# Altium footprint library zynq.PcbLib: 111 footprints (part 6 of 7)
Each footprint in its own frame and in the unit in brackets; x right, y up, seen from the top. Pads: shape width x height; smd on the part's side, far side on the other; paste and mask are expansions set on the pad; w line width, h text height; cw(c..) or ccw(c..) is an arc to the next point about the centre after c.
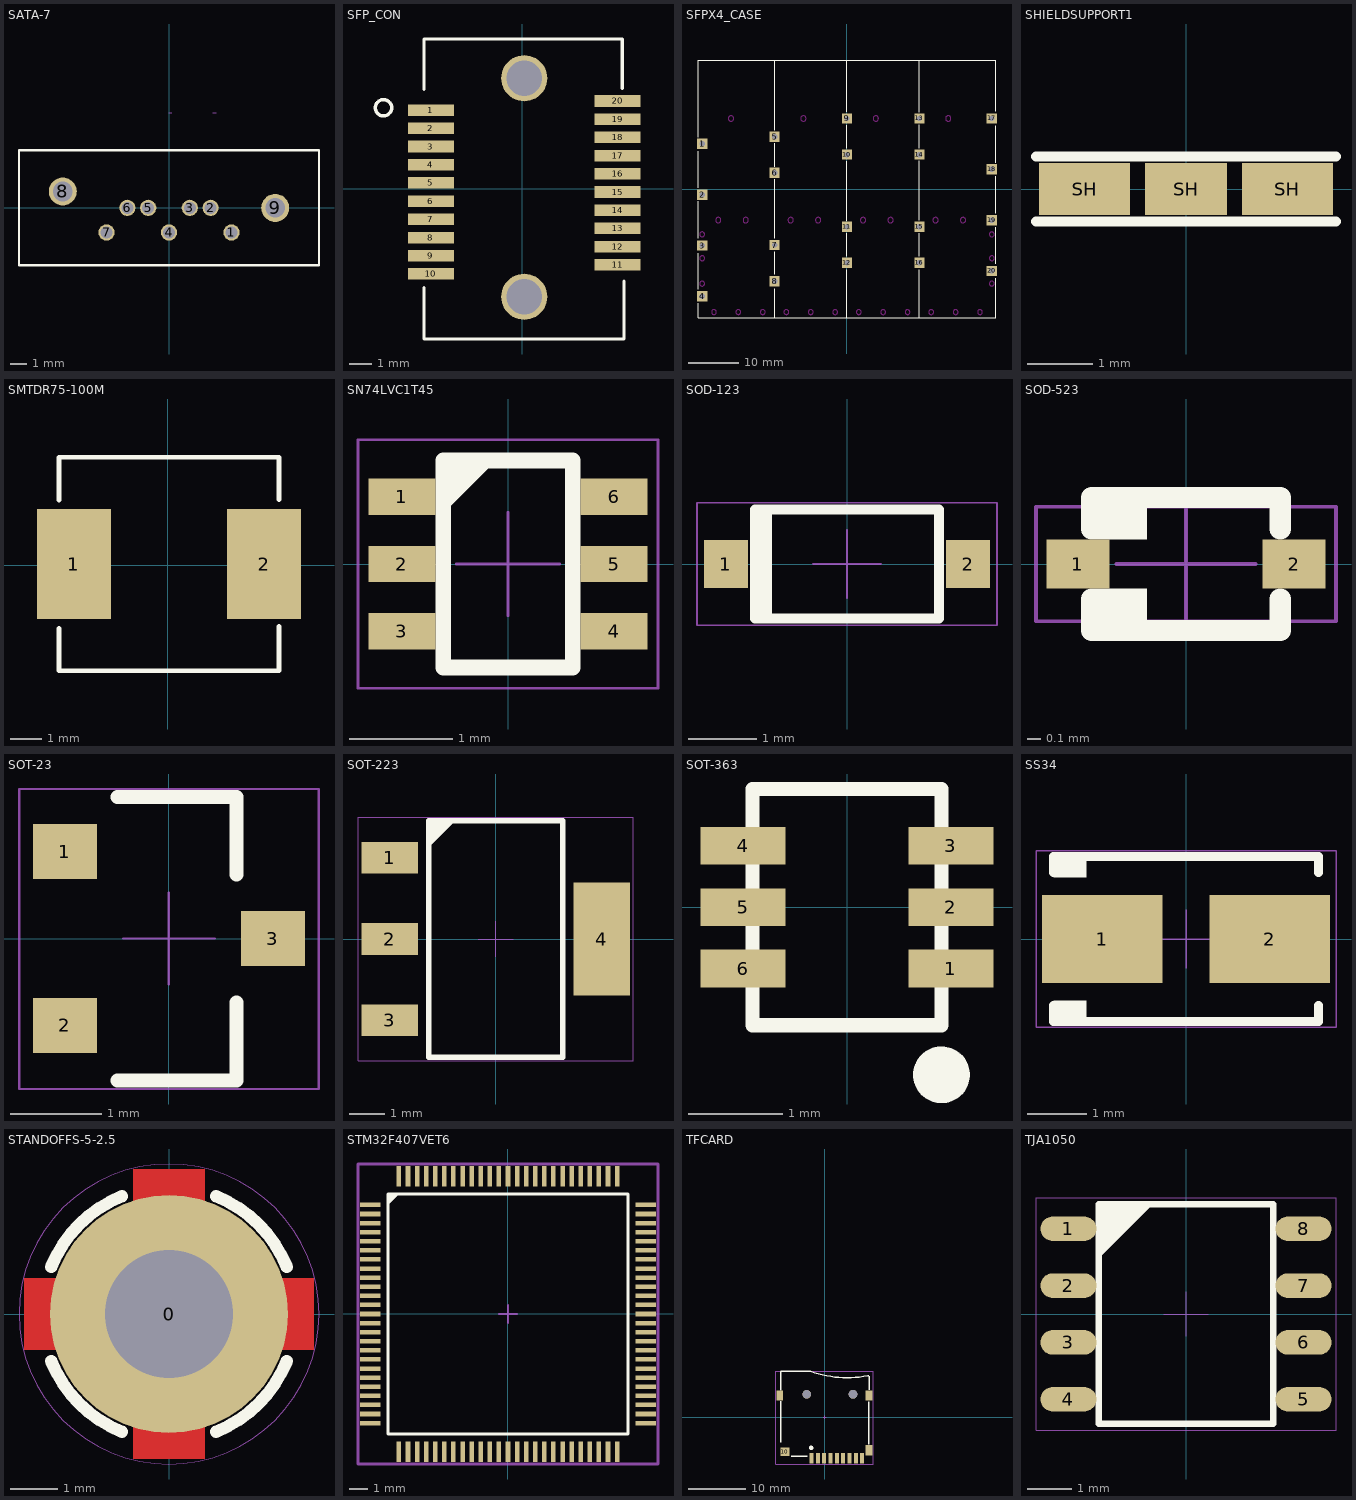
[diagram p5: the footprints below, top view; thin cyan lines are the x and y axes]

## SATA-7 [mm] "SATA-7"
pads (9):
  round 0.994 hole 0.74: 1(3.81,-1.5) 2(2.54,0) 3(1.27,0) 4(0,-1.5) 5(-1.27,0) 6(-2.54,0) 7(-3.81,-1.5)
  round 1.708 hole 1.2: 8(-6.48,1) 9(6.48,0)
Top Overlay:
  lines w0.152: -9.15,-3.5 -9.15,3.5 9.15,3.5 9.15,-3.5 -9.15,-3.5
Mechanical 11:
  lines w0.025: -0.025,5.802 0.178,5.802 ; 2.667,5.802 2.87,5.802

## SFP_CON [mil] "SFP_CON"
pads (22):
  rect 80x20 smd: 1(-158,136) 2(-158,104.5) 3(-158,73.01) 4(-158,41.51) 5(-158,10.02) 6(-158,-21.48) 7(-158,-52.98) 8(-158,-84.47) 9(-158,-115.97) 10(-158,-147.46) 11(164.83,-131.72) 12(164.83,-100.22) 13(164.83,-68.72) 14(164.83,-37.23) 15(164.83,-5.73) 16(164.83,25.76) 17(164.83,57.26) 18(164.83,88.76) 19(164.83,120.25) 20(164.83,151.75)
  round 80 hole 62: " "(3.42,-186.83) " "(3.42,191.12)
Top Overlay:
  circle w6: c-240,140 r14.14
  lines w6: -170,-171 -170,-260 176,-260 176,-160 ; -170,172 -170,259 173,259 173,174

## SFPX4_CASE [mil] "SFPX4_CASE"
pads (20):
  rect 80x80 hole 42: 1(-1122.04,349.41) 2(-1122.04,-44.29) 3(-1122.04,-437.99) 4(-1122.04,-831.69) 5(-561.02,404.53) 6(-561.02,125) 7(-561.02,-434.05) 8(-561.02,-713.58) 9(0,546.26) 10(0,266.74) 11(0,-292.32) 12(0,-571.85) 13(561.02,546.26) 14(561.02,266.74) 15(561.02,-292.32) 16(561.02,-571.85) 17(1122.04,546.26) 18(1122.04,152.56) 19(1122.04,-241.14) 20(1122.04,-634.84)
Top Overlay:
  lines w6: -1153.54,-885.98 -1153.54,-999.01 1153.54,-999.01 1153.54,-690.98 ; -1153.54,-775.98 -1153.54,-495.98 ; -1153.54,-380.98 -1153.54,-95.98 ; -1153.54,9.02 -1153.54,294.02 ; -1153.54,399.02 -1153.54,999.02 1153.54,999.02 1153.54,604.02 ; -561.02,-995.98 -561.02,-770.98 ; -561.02,-660.98 -561.02,-485.98 ; -561.02,-380.98 -561.02,74.02 ; -561.02,174.02 -561.02,354.02 ; -561.02,454.02 -561.02,998 -560,999.02 ; 0,-995.98 0,-625.98 ; 0,-520.98 0,-340.98 ; 0,-245.98 0,214.02 ; 0,314.02 0,494.02 ; 0,599.02 0,998 1.02,999.02 ; 561.02,-995.98 561.02,-625.98 ; 561.02,-520.98 561.02,-340.98 ; 561.02,-240.98 561.02,219.02 ; 561.02,314.02 561.02,499.02 ; 561.02,594.02 561.02,998 562.04,999.02 ; 1153.54,-580.98 1153.54,-295.98 ; 1153.54,-185.98 1153.54,99.02 ; 1153.54,204.02 1153.54,489.02
Keep-Out Layer:
  circle w1: c-337.79,546.26 r21
  circle w1: c-223.62,-241.14 r21
  circle w1: c-436.22,-241.14 r21
  circle w1: c223.23,546.26 r21
  circle w1: c337.4,-241.14 r21
  circle w1: c124.8,-241.14 r21
  circle w1: c-280.71,-953.74 r19
  circle w1: c-469.68,-953.74 r19
  circle w1: c-91.73,-953.74 r19
  circle w1: c280.31,-953.74 r19
  circle w1: c91.34,-953.74 r19
  circle w1: c469.29,-953.74 r19
  circle w1: c-997.24,-241.14 r21
  circle w1: c-784.64,-241.14 r21
  circle w1: c-1122.04,-351.38 r19
  circle w1: c-1122.04,-536.42 r19
  circle w1: c-1122.04,-733.27 r19
  circle w1: c-841.73,-953.74 r19
  circle w1: c-1030.7,-953.74 r19
  circle w1: c-652.75,-953.74 r19
  circle w1: c-898.81,546.26 r21
  circle w1: c784.25,546.26 r21
  circle w1: c685.82,-241.14 r21
  circle w1: c898.42,-241.14 r21
  circle w1: c1122.04,-351.38 r19
  circle w1: c1122.04,-536.42 r19
  circle w1: c1122.04,-733.27 r19
  circle w1: c652.36,-953.74 r19
  circle w1: c841.33,-953.74 r19
  circle w1: c1030.31,-953.74 r19
Mechanical 10:
  text "1" at -1122.04,359.41 h25
  text "2" at -1122.04,-34.29 h25
  text "3" at -1122.04,-427.99 h25
  text "4" at -1122.04,-821.69 h25
  text "5" at -561.02,414.53 h25
  text "6" at -561.02,135 h25
  text "7" at -561.02,-424.05 h25
  text "8" at -561.02,-703.58 h25
  text "9" at 0,556.26 h25
  text "10" at 0,286.74 h25
  text "11" at 0,-272.32 h25
  text "12" at 0,-551.85 h25
  text "13" at 561.02,566.26 h25
  text "14" at 561.02,286.74 h25
  text "15" at 561.02,-272.32 h25
  text "16" at 561.02,-551.85 h25
  text "17" at 1122.04,566.26 h25
  text "18" at 1122.04,172.56 h25
  text "19" at 1122.04,-221.14 h25
  text "20" at 1122.04,-614.84 h25

## SHIELDSUPPORT1 [mm] "YS0073A1 L4.4xW0.8xH0.8 0.2"
pads (3):
  rect 1.4x0.8 smd: SH(-1.555,0) SH(1.555,0)
  rect 1.25x0.8 smd: SH(0,0)
Top Overlay:
  lines w0.152: -2.3,-0.5 2.3,-0.5 ; -2.3,0.5 2.3,0.5

## SMTDR75-100M [mil] "SMTDR75-100M"
pads (2):
  rect 92.5x137.8 smd: 1(-117.59,1.5) 2(120.59,1.5)
Top Overlay:
  lines w6: -136.3,-79.5 -136.3,-132.36 139.3,-132.36 139.3,-76.5 ; -136.3,81.5 -136.3,135.36 139.3,135.36 139.3,82.5

## SN74LVC1T45 [mm]
height 1
pads (6):
  rect 0.65x0.35 smd: 1(-1.025,0.65) 2(-1.025,0) 3(-1.025,-0.65) 4(1.025,-0.65) 5(1.025,0) 6(1.025,0.65)
Top Overlay:
  region: -0.127,0.991 -0.625,0.492 -0.625,1
  lines w0.152: -0.625,-1 0.625,-1 0.625,1 -0.625,1 -0.625,-1
Mechanical 15:
  lines w0.025: -0.5,0 0.5,0 ; 0,-0.5 0,0.5 ; -1.45,-1.2 1.45,-1.2 1.45,1.2 -1.45,1.2 -1.45,-1.2
3D body "sn74lvc1t45dckr.STEP": height 0.98, standoff 0, extent -1.035,-1 1.035,1

## SOD-123 [mm]
pads (2):
  rect 0.65x0.7 smd: 1(-1.775,0) 2(1.775,0)
Top Overlay:
  rectangle: -1.35,-0.8 -1.1,0.8
  lines w0.152: -1.35,-0.8 -1.35,0.8 1.35,0.8 1.35,-0.8 -1.35,-0.8
Mechanical 15:
  lines w0.025: -0.5,0 0.5,0 ; 0,-0.5 0,0.5 ; -2.2,-0.9 2.2,-0.9 2.2,0.9 -2.2,0.9 -2.2,-0.9
3D body "sod123.STEP": height 1.17, standoff 0, extent -1.85,-0.8 1.85,0.8

## SOD-523 [mm]
pads (2):
  rect 0.45x0.35 smd: 1(-0.775,0) 2(0.775,0)
Top Overlay:
  rectangle: -0.676,0.174 -0.281,0.476
  rectangle: -0.676,-0.476 -0.281,-0.174
  lines w0.152: -0.676,-0.25 -0.676,-0.476 0.676,-0.476 0.676,-0.25 ; -0.676,0.25 -0.676,0.476 0.676,0.476 0.676,0.25
Mechanical 15:
  lines w0.025: -0.5,0 0.5,0 ; 0,-0.5 0,0.5 ; -1.075,-0.41 -1.075,0.41 1.075,0.41 1.075,-0.41 -1.075,-0.41
3D body "sod523.STEP": height 0.65, standoff 0, extent -0.774,-0.402 0.773,0.398

## SOT-23 [mm] "SOT-23"
pads (3):
  rect 0.7x0.6 smd: 1(-1.137,0.95) 2(-1.137,-0.95) 3(1.138,0)
Top Overlay:
  lines w0.152: -0.562,-1.55 0.738,-1.55 0.738,-0.7 ; -0.562,1.55 0.738,1.55 0.738,0.7
Mechanical 15:
  lines w0.025: -0.5,0 0.5,0 ; 0,-0.5 0,0.5 ; -1.637,-1.645 -1.637,1.635 1.64,1.635 1.64,-1.645 -1.637,-1.645
3D body "sot23-3.STEP": height 1.04, standoff 0, extent -1.244,-1.499 1.221,1.501

## SOT-223 [mm] "SOT223, 4-Leads, Body 6.50x7.00mm (avg), Pitch 2.30mm, IPC High Density"
height 1.8
pads (4):
  rect 1.6x0.9 smd: 1(-3,2.3) 2(-3,0) 3(-3,-2.3)
  rect 1.6x3.2 smd: 4(3,0)
Top Overlay:
  region: -1.9,3.35 -1.15,3.35 -1.9,2.6
  lines w0.152: -1.9,-3.35 1.9,-3.35 1.9,3.35 -1.9,3.35 -1.9,-3.35
Mechanical 15:
  lines w0.025: -0.5,0 0.5,0 ; 0,-0.5 0,0.5 ; -3.9,-3.45 3.9,-3.45 3.9,3.45 -3.9,3.45 -3.9,-3.45
3D body "sot223.STEP": height 1.68, standoff 0.01, extent -3.408,-3.244 3.431,3.256

## SOT-363 [mm]
pads (6):
  rect 0.9x0.4 smd: 1(1.1,-0.65) 2(1.1,0) 3(1.1,0.65) 4(-1.1,0.65) 5(-1.1,0) 6(-1.1,-0.65)
Top Overlay:
  circle w0.3: c1,-1.773 r0.15
  lines w0.152: -1,-1.25 1,-1.25 1,1.25 -1,1.25 -1,-1.25

## SS34 [mm] "Molded Diode, 2-Leads, Body 4.25x2.67mm, IPC High Density"
height 2.42
pads (2):
  rect 2.05x1.5 smd: 1(-1.425,0) 2(1.425,0)
Top Overlay:
  rectangle: -2.25,-1.4 -1.691,-1.049
  rectangle: -2.25,1.049 -1.691,1.4
  lines w0.152: -2.25,-1.126 -2.25,-1.4 2.25,-1.4 2.25,-1.126 ; -2.25,1.126 -2.25,1.4 2.25,1.4 2.25,1.126
Mechanical 15:
  lines w0.025: -0.5,0 0.5,0 ; 0,-0.5 0,0.5 ; -2.55,-1.5 2.55,-1.5 2.55,1.5 -2.55,1.5 -2.55,-1.5
3D body "do-214ac.STEP": height 2.06, standoff 0.01, extent -2.351,-1.324 2.351,1.346

## STANDOFFS-5-2.5 [mm] "外径5 台阶外径2.5"
pads (1):
  round 5 / inner round 5 / far side round 0 hole 2.7: 0(0,0)
Top Layer:
  region: 0.762,-1.422 -0.762,-1.422 -0.762,-3.048 0.762,-3.048
  region: 1.422,0.762 1.422,-0.762 3.048,-0.762 3.048,0.762
  rectangle: -0.762,1.422 0.762,3.048
  region: -1.422,-0.762 -1.422,0.762 -3.048,0.762 -3.048,-0.762
Top Overlay:
  lines w0.254: -2.476,-0.99 ccw(c0,0) -0.99,-2.476 ; -2.476,0.99 cw(c0,0) -0.99,2.476 ; 0.99,-2.476 ccw(c0,0) 2.476,-0.99 ; 0.99,2.476 cw(c0,0) 2.476,0.99
Top Paste:
  region: 1.191,2.114 0.818,1.445 1.48,0.783 2.15,1.155
  region: 2.337,0.653 1.6,0.443 1.6,-0.493 2.337,-0.704
  region: 2.337,0.653 1.6,0.443 1.6,-0.493 2.337,-0.704
  region: 2.114,-1.191 1.445,-0.818 0.783,-1.48 1.155,-2.15
  region: 0.653,-2.337 0.443,-1.6 -0.493,-1.6 -0.704,-2.337
  region: -1.191,-2.114 -0.818,-1.445 -1.48,-0.783 -2.15,-1.155
  region: -2.337,-0.653 -1.6,-0.443 -1.6,0.493 -2.337,0.704
  region: -2.114,1.191 -1.445,0.818 -0.783,1.48 -1.155,2.15
  region: -0.653,2.337 -0.443,1.6 0.493,1.6 0.704,2.337
Top Solder:
  region: 0.762,-1.422 -0.762,-1.422 -0.762,-3.048 0.762,-3.048
  region: 1.422,0.762 1.422,-0.762 3.048,-0.762 3.048,0.762
  rectangle: -0.762,1.422 0.762,3.048
  region: -1.422,-0.762 -1.422,0.762 -3.048,0.762 -3.048,-0.762
Mechanical 15:
  circle w0.025: c0,0 r3.155
  lines w0.025: -0.381,0 0.381,0 ; 0,-0.381 0,0.381
3D body "cp-m2-3.2-5.SLDPRT": height 3.2, standoff -1.5, extent -2.497,-2.5 2.497,2.5

## STM32F407VET6 [mm]
pads (100):
  rect 1.15x0.25 smd: 1(-7.575,6) 2(-7.575,5.5) 3(-7.575,5) 4(-7.575,4.5) 5(-7.575,4) 6(-7.575,3.5) 7(-7.575,3) 8(-7.575,2.5) 9(-7.575,2) 10(-7.575,1.5) 11(-7.575,1) 12(-7.575,0.5) 13(-7.575,0) 14(-7.575,-0.5) 15(-7.575,-1) 16(-7.575,-1.5) 17(-7.575,-2) 18(-7.575,-2.5) 19(-7.575,-3) 20(-7.575,-3.5) 21(-7.575,-4) 22(-7.575,-4.5) 23(-7.575,-5) 24(-7.575,-5.5) 25(-7.575,-6) 51(7.575,-6) 52(7.575,-5.5) 53(7.575,-5) 54(7.575,-4.5) 55(7.575,-4) 56(7.575,-3.5) 57(7.575,-3) 58(7.575,-2.5) 59(7.575,-2) 60(7.575,-1.5) 61(7.575,-1) 62(7.575,-0.5) 63(7.575,0) 64(7.575,0.5) 65(7.575,1) 66(7.575,1.5) 67(7.575,2) 68(7.575,2.5) 69(7.575,3) 70(7.575,3.5) 71(7.575,4) 72(7.575,4.5) 73(7.575,5) 74(7.575,5.5) 75(7.575,6)
  rect 0.25x1.15 smd: 26(-6,-7.575) 27(-5.5,-7.575) 28(-5,-7.575) 29(-4.5,-7.575) 30(-4,-7.575) 31(-3.5,-7.575) 32(-3,-7.575) 33(-2.5,-7.575) 34(-2,-7.575) 35(-1.5,-7.575) 36(-1,-7.575) 37(-0.5,-7.575) 38(0,-7.575) 39(0.5,-7.575) 40(1,-7.575) 41(1.5,-7.575) 42(2,-7.575) 43(2.5,-7.575) 44(3,-7.575) 45(3.5,-7.575) 46(4,-7.575) 47(4.5,-7.575) 48(5,-7.575) 49(5.5,-7.575) 50(6,-7.575) 76(6,7.575) 77(5.5,7.575) 78(5,7.575) 79(4.5,7.575) 80(4,7.575) 81(3.5,7.575) 82(3,7.575) 83(2.5,7.575) 84(2,7.575) 85(1.5,7.575) 86(1,7.575) 87(0.5,7.575) 88(0,7.575) 89(-0.5,7.575) 90(-1,7.575) 91(-1.5,7.575) 92(-2,7.575) 93(-2.5,7.575) 94(-3,7.575) 95(-3.5,7.575) 96(-4,7.575) 97(-4.5,7.575) 98(-5,7.575) 99(-5.5,7.575) 100(-6,7.575)
Top Overlay:
  region: -5.969,6.604 -6.604,5.969 -6.604,6.596 -6.6,6.6
  lines w0.152: -6.6,-6.6 6.6,-6.6 6.6,6.6 -6.6,6.6 -6.6,-6.6
Mechanical 15:
  lines w0.1: -0.5,0 0.5,0 ; 0,-0.5 0,0.5
  lines w0.152: -8.25,-8.25 8.25,-8.25 8.25,8.25 -8.25,8.25 -8.25,-8.25

## TFCARD [mil]
pads (15):
  rect 27.56x70.87 smd: 1(-92,-280.5) 2(-48.69,-280.5) 3(-5.39,-280.5) 4(37.92,-280.5) 5(81.23,-280.5) 6(124.54,-280.5) 7(167.84,-280.5) 8(211.15,-280.5) 9(254.46,-280.5)
  rect 62.99x59.06 smd: 10(-273.1,-235.22)
  rect 47.24x70.87 smd: 11(301.7,-225.38) 12(301.7,148.63) 13(-308.54,148.63)
  round 59.06 hole 59.06 unplated: ""(-124,156.51) ""(192,156.51)
Top Overlay:
  circle w29.53: c-93.86,-210 r1
  lines w10: -301.54,-172.5 -301.54,107.5 ; -301.54,185.5 -301.54,311.5 ; -301.54,313.5 -98.06,313.5 ccw(c151.13,1000.55) 292.46,283.5 300.46,283.5 ; -231.54,-266.5 -119.54,-266.5 ; 300.46,-184.5 300.46,105.5 ; 302.46,187.5 302.46,281.5
Mechanical 15:
  lines w1: -10,0 10,0 ; 0,-10 0,10 ; -335,-320 330,-320 330,315 -335,315 -335,-320
Multi-Layer:
  circle w1: c191.46,156.51 r29.64
  circle w1: c-123.5,156.51 r29.64

## TJA1050 [mm]
height 1.75
pads (8):
  oval 1.25x0.55 smd: 1(-2.625,1.905) 2(-2.625,0.635) 3(-2.625,-0.635) 4(-2.625,-1.905) 5(2.625,-1.905) 6(2.625,-0.635) 7(2.625,0.635) 8(2.625,1.905)
Top Overlay:
  region: -1.936,2.371 -1.916,2.391 -0.8,2.391 -1.95,1.241
  lines w0.152: -1.95,-2.45 1.95,-2.45 1.95,2.45 -1.95,2.45 -1.95,-2.45
Mechanical 15:
  lines w0.025: -0.5,0 0.5,0 ; 0,-0.5 0,0.5 ; -3.35,-2.6 3.35,-2.6 3.35,2.6 -3.35,2.6 -3.35,-2.6
3D body "tja1050.STEP": height 1.66, standoff 0, extent -3.078,-2.483 3.077,2.417